# Altium footprint library HamedLib.PcbLib: 221 footprints (part 4 of 14)
Each footprint in its own frame and in the unit in brackets; x right, y up, seen from the top. Pads: shape width x height; smd on the part's side, far side on the other; paste and mask are expansions set on the pad; w line width, h text height; cw(c..) or ccw(c..) is an arc to the next point about the centre after c.
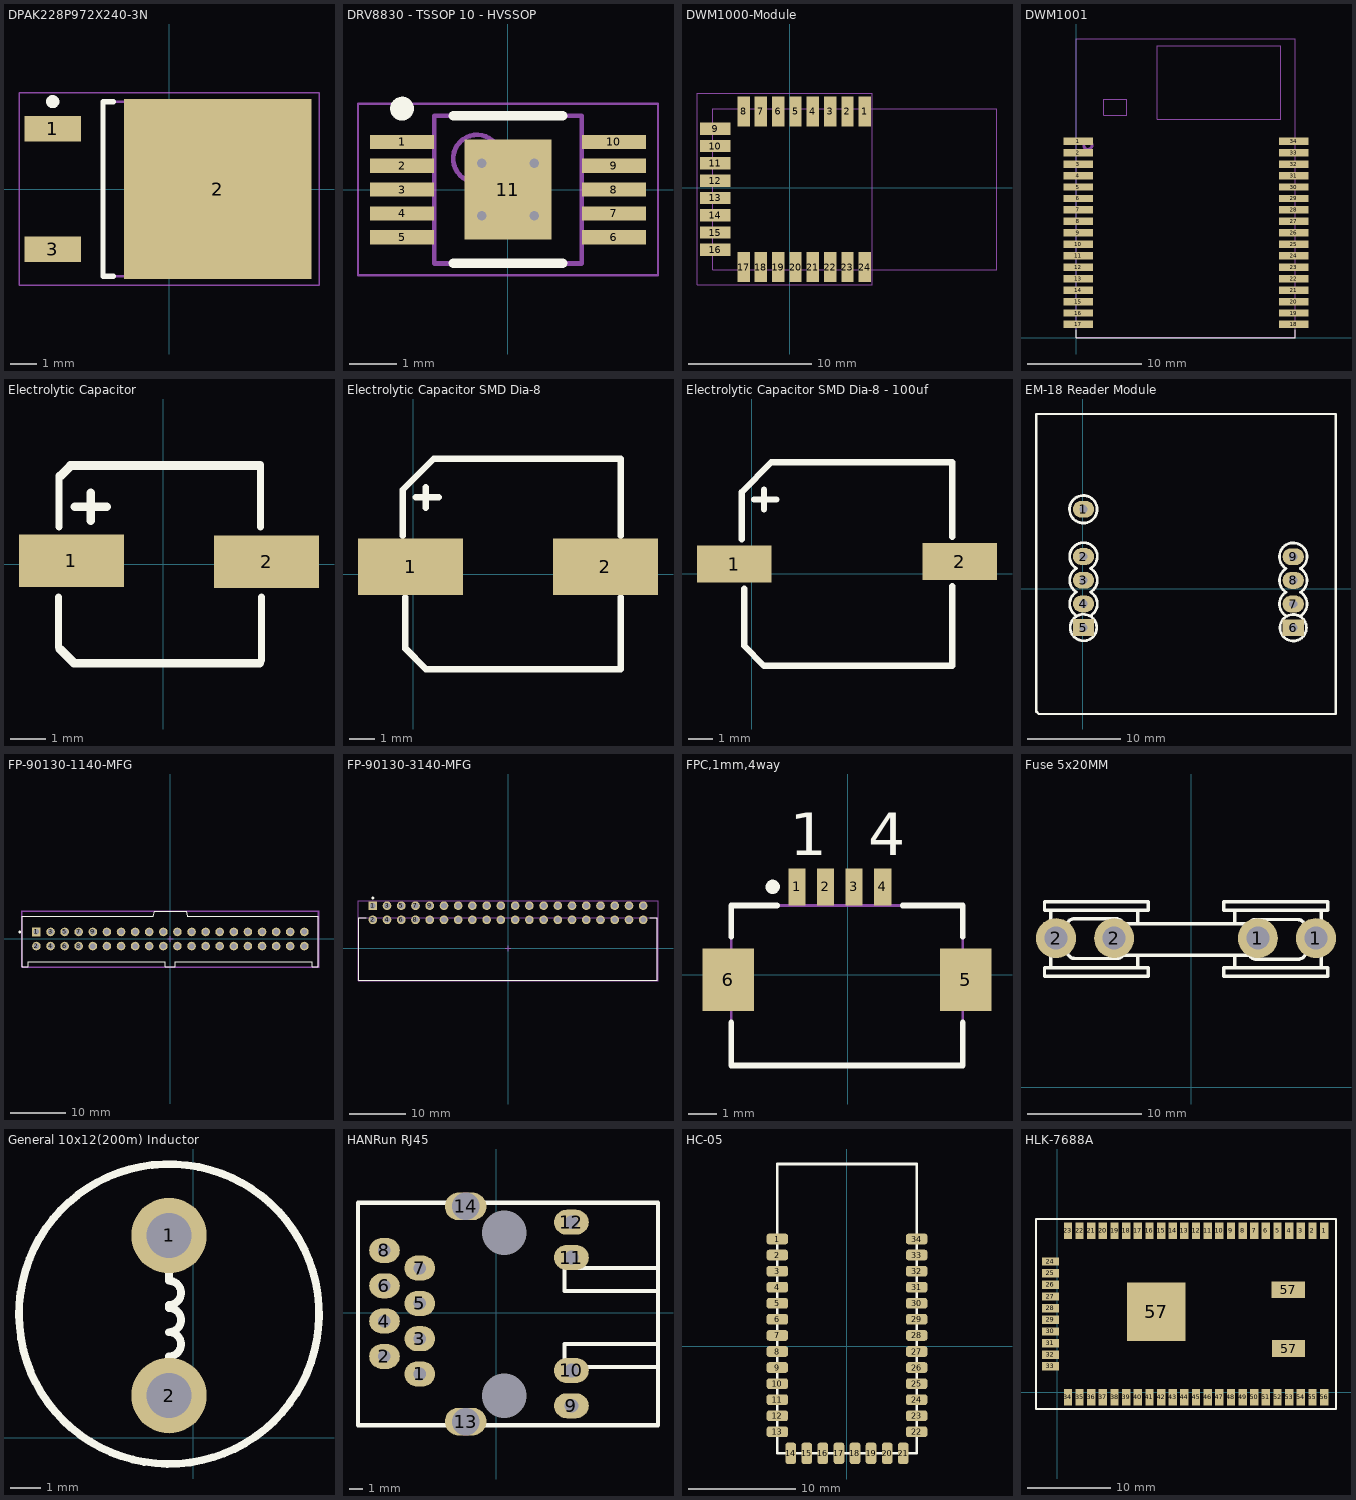
[diagram p3: the footprints below, top view; thin cyan lines are the x and y axes]

## DPAK228P972X240-3N [mm] "D-PAK, 3-Pads, Body 6.20x6.66mm (max), IPC Medium Density"
height 2.4
pads (3):
  rect 2.15x0.95 smd: 1(-4.4,2.28) 3(-4.4,-2.28)
  rect 7.1x6.8 smd: 2(1.85,0)
Top Overlay:
  circle w0.25: c-4.4,3.305 r0.125
  lines w0.2: -2.1,-3.3 -2.5,-3.3 -2.5,3.3 -2.1,3.3
Mechanical 13:
  lines w0.1: -2.5,-3.3 3.7,-3.3 3.7,3.3 -2.5,3.3 -2.5,-3.3
Mechanical 15:
  lines w0.05: -5.675,-3.65 5.675,-3.65 5.675,3.65 -5.675,3.65 -5.675,-3.65
  lines w0.1: -0.5,0 0.5,0 ; 0,-0.5 0,0.5
3D body "User Library-DPAK_TO-252AA.step": height 2.37, standoff -0.03, extent -4.95,-3.434 5.15,3.3

## DRV8830 - TSSOP 10 - HVSSOP [mm] "TSSOP, 10-Leads, Body 3.00x3.00mm, Pitch 0.50mm, Thermal Pad 2.10x1.83mm, IPC Medium Density"
height 1.1
pads (11):
  rect 1.35x0.3 smd: 1(-2.225,1) 2(-2.225,0.5) 3(-2.225,0) 4(-2.225,-0.5) 5(-2.225,-1) 6(2.225,-1) 7(2.225,-0.5) 8(2.225,0) 9(2.225,0.5) 10(2.225,1)
  rect 1.83x2.1 smd: 11(0,0)
via -0.55,0.55 diameter 0.5 hole 0.2
via 0.55,0.55 diameter 0.5 hole 0.2
via -0.55,-0.55 diameter 0.5 hole 0.2
via 0.55,-0.55 diameter 0.5 hole 0.2
Top Overlay:
  circle w0.25: c-2.225,1.7 r0.125
  lines w0.2: -1.15,-1.55 1.15,-1.55 ; -1.15,1.55 1.15,1.55
Mechanical 13:
  circle w0.1: c-0.65,0.65 r0.5
  lines w0.1: -1.55,-1.55 -1.55,1.55 1.55,1.55 1.55,-1.55 -1.55,-1.55
Mechanical 15:
  lines w0.05: -3.15,-1.8 -3.15,1.8 3.15,1.8 3.15,-1.8 -3.15,-1.8
  lines w0.1: -0.5,0 0.5,0 ; 0,-0.5 0,0.5
3D body "DRV8330 - TSSOP 10 - HVSSOP.step": height 1.1, standoff 0, extent -2.45,-1.55 2.45,1.55

## DWM1000-Module [mm]
pads (24):
  rect 1x2.45 smd: 1(6.062,6.183) 2(4.662,6.183) 3(3.262,6.183) 4(1.862,6.183) 5(0.462,6.183) 6(-0.938,6.183) 7(-2.338,6.183) 8(-3.738,6.183) 17(-3.738,-6.407) 18(-2.338,-6.407) 19(-0.938,-6.407) 20(0.462,-6.407) 21(1.862,-6.407) 22(3.262,-6.407) 23(4.662,-6.407) 24(6.062,-6.407)
  rect 2.45x1 smd: 9(-6.033,4.788) 10(-6.033,3.388) 11(-6.033,1.988) 12(-6.033,0.588) 13(-6.033,-0.812) 14(-6.033,-2.212) 15(-6.033,-3.612) 16(-6.033,-5.012)
Mechanical 13:
  lines w0.05: -6.238,-6.612 -6.238,6.388 16.762,6.388 16.762,-6.612 -6.238,-6.612
Mechanical 15:
  lines w0.05: -7.508,-7.836 -7.508,7.658 6.687,7.658 6.687,-7.836 -7.508,-7.836
3D body "DWM1000 Module.STEP": height 2.9, standoff -0.01, extent -6.251,-6.612 16.749,6.388

## DWM1001 [mm] "DWM1001 MODULE"
height 4
pads (34):
  rect 2.54x0.65 smd: 1(0.16,17.15) 2(0.16,16.15) 3(0.16,15.15) 4(0.16,14.15) 5(0.16,13.15) 6(0.16,12.15) 7(0.16,11.15) 8(0.16,10.15) 9(0.16,9.15) 10(0.16,8.15) 11(0.16,7.15) 12(0.16,6.15) 13(0.16,5.15) 14(0.16,4.15) 15(0.16,3.15) 16(0.16,2.15) 17(0.16,1.15) 18(18.97,1.15) 19(18.97,2.15) 20(18.97,3.15) 21(18.97,4.15) 22(18.97,5.15) 23(18.97,6.15) 24(18.97,7.15) 25(18.97,8.15) 26(18.97,9.15) 27(18.97,10.15) 28(18.97,11.15) 29(18.97,12.15) 30(18.97,13.15) 31(18.97,14.15) 32(18.97,15.15) 33(18.97,16.15) 34(18.97,17.15)
Top Overlay:
  lines w0.1: 0,0.7 0,0 19.1,0 19.1,0.7
Mechanical 1:
  lines w0.1: 0,0 0,26.075 19.1,26.075 19.1,0.025 0,0.025 0,0.9
Mechanical 16:
  circle w0.254: c1,16.8 r0.361
  lines w0.1: 0,0.025 19.1,0.025 19.1,26.075 0,26.075 0,0.025 ; 2.4,19.4 4.4,19.4 4.4,20.8 2.4,20.8 2.4,19.4 ; 7.075,19.05 17.85,19.05 17.85,25.475 7.075,25.475 7.075,19.05
Mechanical 29:
  text ".Designator" at 5.6,11.6 h0.8
3D body "dm1_b2_V2.step": height 4.6, standoff 0.03, extent 0,0 19.125,26.125

## Electrolytic Capacitor [mm] "5Rx5.3 - SMD C"
pads (2):
  rect 3x1.5 smd: 1(-2.625,0.1) 2(2.95,0.075)
Top Overlay:
  lines w0.2: -3,-2.375 -3,-0.925 ; -2.975,1.075 -2.975,2.5 ; 2.7,-2.825 2.725,-2.825 2.8,-2.75 2.8,-0.925 ; 2.775,1.075 2.775,2.85
  lines w0.254: -2.95,-2.425 -2.55,-2.825 2.75,-2.825 ; -2.95,2.525 -2.65,2.825 2.75,2.825 ; -2.525,1.65 -1.625,1.65 ; -2.075,1.25 -2.075,2.05
3D body "User Library-ALU-C.STEP": height 5.41, standoff 0, extent -3.075,-2.625 2.825,2.675

## Electrolytic Capacitor SMD Dia-8 [mm] "470uf,6.3v,16v"
pads (2):
  rect 4.1x2.2 smd: 1(-0.1,0.3) 2(7.5,0.3)
Top Overlay:
  lines w0.254: -0.4,1.5 -0.4,3.3 0.8,4.5 8.1,4.5 8.1,1.5 ; -0.3,-0.9 -0.3,-2.9 0.5,-3.7 8.1,-3.7 8.1,-0.9 ; 0.1,3 1,3 ; 0.5,2.6 0.5,3.4
3D body "User Library-SMD Polymer Aluminum Electrolytic Capacitors E12 470uF 6,3V.step": height 11.9, standoff -0.05, extent -0.6,-3.7 8.4,4.6

## Electrolytic Capacitor SMD Dia-8 - 100uf [mm] "100uf,6.3v,16v"
pads (2):
  rect 3x1.5 smd: 1(-0.7,0.4) 2(8.4,0.5)
Top Overlay:
  lines w0.254: -0.4,1.4 -0.4,3.3 0.8,4.5 8.1,4.5 8.1,1.5 ; -0.3,-0.6 -0.3,-2.9 0.5,-3.7 8.1,-3.7 8.1,-0.5 ; 0.1,3 1,3 ; 0.5,2.6 0.5,3.4
3D body "User Library-SMD Polymer Aluminum Electrolytic Capacitors F8 100uF 16V.step": height 7.9, standoff -0.05, extent -1.7,-4.7 9.3,5.6

## EM-18 Reader Module [mm]
pads (9):
  oval 2.3x1.8 hole 0.9: 1(0.103,8.511) 2(0.103,3.431) 3(0.103,0.891) 4(0.103,-1.649) 7(22.603,-1.667) 8(22.603,0.873) 9(22.603,3.413)
  rect 2.3x1.8 hole 0.9: 5(0.103,-4.189) 6(22.603,-4.207)
Top Overlay:
  circle w0.3: c22.603,-4.207 r1.42
  circle w0.3: c0.103,-4.189 r1.42
  lines w0.254: -4.953,-13.208 -4.953,18.694 -4.928,18.72 27.127,18.72 27.153,18.694 27.153,-13.462 -4.699,-13.462 -4.953,-13.208
  lines w0.3: -0.934,4.488 cw(c0.103,3.431) 0.865,2.161 cw(c0.103,0.891) 0.865,-0.379 cw(c0.103,-1.649) 0.865,-2.919 ; -0.682,7.227 cw(c0.08,8.497) -0.499,7.134 ; -0.659,-2.919 cw(c0.103,-1.649) -0.659,-0.379 cw(c0.103,0.891) -0.659,2.161 cw(c0.103,3.431) -0.659,4.701 ; 21.614,4.516 cw(c22.603,3.413) 23.365,2.143 cw(c22.603,0.873) 23.365,-0.397 cw(c22.603,-1.667) 23.365,-2.937 ; 21.841,-2.937 cw(c22.603,-1.667) 21.841,-0.397 cw(c22.603,0.873) 21.841,2.143 cw(c22.603,3.413) 21.841,4.683
3D body "Em18.STEP": height 8, standoff -5, extent -4.822,-13.308 27.178,18.692

## FP-90130-1140-MFG [mm]
pads (40):
  rect 1.55x1.55 hole 1 paste-2539.97 mask+0: 1(-24.13,1.27)
  round 1.55 hole 1 paste-2539.97 mask+0: 2(-24.13,-1.27) 3(-21.59,1.27) 4(-21.59,-1.27) 5(-19.05,1.27) 6(-19.05,-1.27) 7(-16.51,1.27) 8(-16.51,-1.27) 9(-13.97,1.27) 10(-13.97,-1.27) 11(-11.43,1.27) 12(-11.43,-1.27) 13(-8.89,1.27) 14(-8.89,-1.27) 15(-6.35,1.27) 16(-6.35,-1.27) 17(-3.81,1.27) 18(-3.81,-1.27) 19(-1.27,1.27) 20(-1.27,-1.27) 21(1.27,1.27) 22(1.27,-1.27) 23(3.81,1.27) 24(3.81,-1.27) 25(6.35,1.27) 26(6.35,-1.27) 27(8.89,1.27) 28(8.89,-1.27) 29(11.43,1.27) 30(11.43,-1.27) 31(13.97,1.27) 32(13.97,-1.27) 33(16.51,1.27) 34(16.51,-1.27) 35(19.05,1.27) 36(19.05,-1.27) 37(21.59,1.27) 38(21.59,-1.27) 39(24.13,1.27) 40(24.13,-1.27)
Top Overlay:
  circle w0.25: c-27.145,1.27 r0.125
  lines w0.2: -25.57,-5.025 -26.67,-5.025 -26.67,4.1 -3.053,4.1 -2.845,5.025 2.845,5.025 3.053,4.1 26.67,4.1 26.67,-5.025 25.57,-5.025 ; -25.565,-5.025 -25.565,-4.1 -0.9,-4.1 -0.9,-5.025 0.9,-5.025 0.9,-4.1 25.565,-4.1 25.565,-5.025
Top 3D Body:
  lines w0.2: -26.67,-5.025 -26.67,5.025 26.67,5.025 26.67,-5.025 -26.67,-5.025
Top Courtyard:
  lines w0.2: -26.77,-5.125 -26.77,5.125 26.77,5.125 26.77,-5.125 -26.77,-5.125
Top Assembly:
  lines w0.2: -26.77,-5.125 -26.77,5.125 26.77,5.125 26.77,-5.125 -26.77,-5.125
Top Component Center:
  lines w0.1: -0.5,0 0.5,0 ; 0,-0.5 0,0.5
3D body "Conn_Molex_90130-1140_eec.STEP": height 0.25, standoff 0, extent -26.77,-5.125 26.77,5.125

## FP-90130-3140-MFG [mm]
pads (40):
  rect 1.55x1.55 hole 1 paste-2539.97 mask+0: 1(-24.13,7.628)
  round 1.55 hole 1 paste-2539.97 mask+0: 2(-24.13,5.088) 3(-21.59,7.628) 4(-21.59,5.088) 5(-19.05,7.628) 6(-19.05,5.088) 7(-16.51,7.628) 8(-16.51,5.088) 9(-13.97,7.628) 10(-13.97,5.088) 11(-11.43,7.628) 12(-11.43,5.088) 13(-8.89,7.628) 14(-8.89,5.088) 15(-6.35,7.628) 16(-6.35,5.088) 17(-3.81,7.628) 18(-3.81,5.088) 19(-1.27,7.628) 20(-1.27,5.088) 21(1.27,7.628) 22(1.27,5.088) 23(3.81,7.628) 24(3.81,5.088) 25(6.35,7.628) 26(6.35,5.088) 27(8.89,7.628) 28(8.89,5.088) 29(11.43,7.628) 30(11.43,5.088) 31(13.97,7.628) 32(13.97,5.088) 33(16.51,7.628) 34(16.51,5.088) 35(19.05,7.628) 36(19.05,5.088) 37(21.59,7.628) 38(21.59,5.088) 39(24.13,7.628) 40(24.13,5.088)
Top Overlay:
  circle w0.25: c-24.12,8.978 r0.125
  lines w0.2: -25.28,5.45 -26.67,5.45 -26.67,-5.65 26.67,-5.65 26.67,5.45 25.28,5.45
Top 3D Body:
  lines w0.2: -26.67,-5.65 26.67,-5.65 26.67,5.45 -26.67,5.45 -26.67,-5.65
Top Courtyard:
  lines w0.2: -26.77,-5.75 26.77,-5.75 26.77,8.503 -26.77,8.503 -26.77,-5.75
Top Assembly:
  lines w0.2: -26.77,-5.75 26.77,-5.75 26.77,8.503 -26.77,8.503 -26.77,-5.75
  text ".Designator" at 0,1.376 h1
Top Component Center:
  lines w0.1: -0.5,0 0.5,0 ; 0,-0.5 0,0.5
3D body "Conn_Molex_90130-3140_eec.STEP": height 0.25, standoff 0, extent -26.77,-5.75 26.77,8.503

## FPC,1mm,4way [mm] "FPC 1mm 4way AutoZif"
pads (6):
  rect 0.6x1.3 smd: 1(-1.78,3.07) 2(-0.78,3.07) 3(0.22,3.07) 4(1.22,3.07)
  rect 1.8x2.2 smd: 5(4.12,-0.18) 6(-4.18,-0.18)
Top Overlay:
  circle w0.25: c-2.63,3.07 r0.125
  lines w0.2: -4.08,-1.68 -4.08,-3.18 4.02,-3.18 4.02,-1.68 ; -4.08,1.32 -4.08,2.42 -2.48,2.42 ; 1.92,2.42 4.02,2.42 4.02,1.32
  text "1" at -2.03,4.17 h1.5
  text "4" at 0.72,4.17 h1.5
Mechanical 13:
  lines w0.1: -4.08,-3.18 -4.08,2.42 4.02,2.42 4.02,-3.18 -4.08,-3.18
3D body: height 2, standoff 0, extent -4.08,-3.18 4.02,2.42

## Fuse 5x20MM [mm]
pads (4):
  round 3.5 hole 2: 1(5.8,13.025) 1(10.88,13.025) 2(-11.823,13.025) 2(-6.743,13.025)
Top Overlay:
  lines w0.3: -12.829,16.176 -12.829,15.465 -3.761,15.465 -3.761,16.201 -12.829,16.201 ; -12.27,10.435 -12.27,15.465 ; -10.314,11.248 -6.428,11.248 ; -10.162,11.248 cw(c-10.162,11.985) -10.898,11.985 -10.924,14.017 cw(c-10.213,14.017) -10.213,14.728 -9.146,14.728 -6.606,14.728 cw(c-6.606,13.991) -5.869,13.991 -5.869,11.959 ; -6.555,11.248 ccw(c-6.555,11.959) -5.844,11.959 ; -5.996,11.528 5.053,11.528 ; -5.92,14.296 5.027,14.296 ; -4.701,10.486 -4.701,11.528 ; -4.701,14.296 -4.701,15.439 ; -3.761,9.699 -12.829,9.699 -12.829,10.435 -3.761,10.435 -3.761,9.724 ; 2.843,16.176 2.843,15.465 11.911,15.465 11.911,16.201 2.843,16.201 ; 3.783,10.461 3.783,11.502 ; 3.783,14.296 3.783,15.414 ; 4.926,13.941 cw(c5.637,13.941) 5.637,14.652 ; 4.951,13.941 4.951,11.909 ccw(c5.688,11.909) 5.688,11.172 8.228,11.172 9.295,11.172 ccw(c9.295,11.883) 10.006,11.883 9.98,13.915 ccw(c9.244,13.915) 9.244,14.652 ; 5.51,14.652 9.396,14.652 ; 11.352,10.435 11.352,15.465 ; 11.911,9.699 2.843,9.699 2.843,10.435 11.911,10.435 11.911,9.724
3D body "User Library-5x20mm PCB Fuse Holder Assy_ 1.STEP": height 14.97, standoff -3.38, extent -12.575,8.5 11.675,17.5

## General 10x12(200m) Inductor [mm]
height 10
pads (2):
  round 2.5 hole 1.5: 1(-0.8,6.7) 2(-0.8,1.4)
Top Overlay:
  lines w0.254: -0.8,2.4 -0.8,2.7 ccw(c-0.8,3.1) -0.8,3.5 ccw(c-0.8,3.9) -0.8,4.3 ; -0.8,4.4 ccw(c-0.8,4.8) -0.8,5.2 -0.8,5.6 ; 2.34,0.251 cw(c-0.8,4.1) 2.4,0.3
3D body "User Library-Inductor 10x12 (200 mils).STEP": height 11.63, standoff -4.37, extent -5.865,-1 4.135,9

## HANRun RJ45 [mm]
pads (16):
  oval 2.2x1.8 hole 0.9: 1(-5.5,-4.401) 2(-8.04,-3.131) 3(-5.5,-1.861) 4(-8.04,-0.591) 5(-5.5,0.679) 6(-8.04,1.949) 7(-5.5,3.219) 8(-8.04,4.489)
  oval 2.5x1.8 hole 1: 9(5.414,-6.687) 10(5.414,-4.147) 11(5.414,3.981) 12(5.414,6.521)
  oval 3x2 hole 2: 13(-2.198,-7.83) 14(-2.198,7.664)
  round 3.1 hole 3.2: ""(0.596,-5.976) ""(0.596,5.759)
Top Overlay:
  lines w0.3: 11.518,-3.893 4.914,-3.893 4.914,-2.242 11.518,-2.242 ; 11.518,1.568 4.914,1.568 4.914,3.219 11.518,3.219 ; -9.945,-8.084 11.645,-8.084 11.645,7.918 -9.945,7.918 -9.945,-8.084
3D body "User Library-HR911105A.step": height 15, standoff -1.5, extent -9.7,-7.9 11.7,7.98

## HC-05 [mm]
pads (34):
  rrect50% 2x1 smd: 1(-6.5,10) 2(-6.5,8.5) 3(-6.5,7) 4(-6.5,5.5) 5(-6.5,4) 6(-6.5,2.5) 7(-6.5,1) 8(-6.5,-0.5) 9(-6.5,-2) 10(-6.5,-3.5) 11(-6.5,-5) 12(-6.5,-6.5) 13(-6.5,-8) 22(6.5,-8) 23(6.5,-6.5) 24(6.5,-5) 25(6.5,-3.5) 26(6.5,-2) 27(6.5,-0.5) 28(6.5,1) 29(6.5,2.5) 30(6.5,4) 31(6.5,5.5) 32(6.5,7) 33(6.5,8.5) 34(6.5,10)
  rrect50% 1x2 smd: 14(-5.254,-10) 15(-3.754,-10) 16(-2.254,-10) 17(-0.754,-10) 18(0.746,-10) 19(2.246,-10) 20(3.746,-10) 21(5.246,-10)
Top Overlay:
  lines w0.254: -6.5,-10 -6.5,17 6.5,17 6.5,-10 -6.5,-10
3D body "User Library-Module Bluetooth.STEP": height 2.5, standoff 0.06, extent -6.501,-9.768 6.501,17.133

## HLK-7688A [mm]
height 3.1
pads (59):
  rect 1x2 smd: 1(32.1,19.4) 2(30.7,19.4) 3(29.3,19.4) 4(27.9,19.4) 5(26.5,19.4) 6(25.1,19.4) 7(23.7,19.4) 8(22.3,19.4) 9(20.9,19.4) 10(19.5,19.4) 11(18.1,19.4) 12(16.7,19.4) 13(15.3,19.4) 14(13.9,19.4) 15(12.5,19.4) 16(11.1,19.4) 17(9.7,19.4) 18(8.3,19.4) 19(6.9,19.4) 20(5.5,19.4) 21(4.1,19.4) 22(2.7,19.4) 23(1.3,19.4) 34(1.3,-0.6) 35(2.7,-0.6) 36(4.1,-0.6) 37(5.5,-0.6) 38(6.9,-0.6) 39(8.3,-0.6) 40(9.7,-0.6) 41(11.1,-0.6) 42(12.5,-0.6) 43(13.9,-0.6) 44(15.3,-0.6) 45(16.7,-0.6) 46(18.1,-0.6) 47(19.5,-0.6) 48(20.9,-0.6) 49(22.3,-0.6) 50(23.7,-0.6) 51(25.1,-0.6) 52(26.5,-0.6) 53(27.9,-0.6) 54(29.3,-0.6) 55(30.7,-0.6) 56(32.1,-0.6)
  rect 2x1 smd: 24(-0.8,15.7) 25(-0.8,14.3) 26(-0.8,12.9) 27(-0.8,11.5) 28(-0.8,10.1) 29(-0.8,8.7) 30(-0.8,7.3) 31(-0.8,5.9) 32(-0.8,4.5) 33(-0.8,3.1)
  rect 7x7 smd: 57(11.925,9.675)
  rect 4x2 smd: 57(27.8,12.3) 57(27.825,5.25)
Top Overlay:
  lines w0.254: -2.54,-2.032 33.528,-2.032 33.528,20.828 33.02,20.828 -2.54,20.828 -2.54,-2.032
3D body "HLK-7688A.STEP": height 3.1, standoff 0, extent 0,0 33.2,18.7